# Altium schematic symbol library FPGA_Xilinx_Virtex5.SchLib: 41 symbols (part 15 of 17) (continued)
## XC5VTX150T-FF1156 (continued)
part O pins: A11 MGTRXP1_128, A12 MGTRXN1_128, A13 MGTRXN0_128, A14 MGTRXP0_128, A21 MGTRXP0_127, A22 MGTRXN0_127, A23 MGTRXN1_127, A24 MGTRXP1_127, B10 MGTTXP1_128, B11 MGTTXN1_128, B14 MGTTXN0_128, B15 MGTTXP0_128, B20 MGTTXP0_127, B21 MGTTXN0_127, B24 MGTTXN1_127, B25 MGTTXP1_127, D13 MGTREFCLKN_128, D14 MGTREFCLKP_128, D21 MGTREFCLKP_127, D22 MGTREFCLKN_127
part P pins: AL13 MGTREFCLKP_130, AL22 MGTREFCLKP_129, AM13 MGTREFCLKN_130, AM22 MGTREFCLKN_129, AN10 MGTTXP0_130, AN11 MGTTXN0_130, AN14 MGTTXN1_130, AN15 MGTTXP1_130, AN20 MGTTXP1_129, AN21 MGTTXN1_129, AN24 MGTTXN0_129, AN25 MGTTXP0_129, AP11 MGTRXP0_130, AP12 MGTRXN0_130, AP13 MGTRXN1_130, AP14 MGTRXP1_130, AP21 MGTRXP1_129, AP22 MGTRXN1_129, AP23 MGTRXN0_129, AP24 MGTRXP0_129
part Q pins: AA3 MGTAVCC_114, AA32 MGTAVCC_113, AB3 MGTAVCCPLL_114, AB32 MGTAVCCPLL_113, AC3 MGTAVTTTX_114, AC32 MGTAVTTTX_113, AE3 MGTAVTTRX_118, AE32 MGTAVTTRX_117, AG3 MGTAVCC_118, AG32 MGTAVCC_117, AH3 MGTAVCCPLL_118, AH32 MGTAVCCPLL_117, AJ3 MGTAVTTTX_118, AJ32 MGTAVTTTX_117, AL3 MGTAVTTRX_122, AL4 MGTAVCC_122, AL31 MGTAVCC_121, AL32 MGTAVTTRX_121, AM3 MGTAVTTTX_122, AM4 MGTAVCCPLL_122, AM6 MGTAVTTRX_126, AM8 MGTAVCC_126, AM9 MGTAVCCPLL_126, AM10 MGTAVTTTX_126, AM12 MGTAVTTRX_130, AM14 MGTAVCC_130, AM15 MGTAVCCPLL_130, AM20 MGTAVCCPLL_129, AM21 MGTAVCC_129, AM23 MGTAVTTRX_129, AM25 MGTAVTTTX_125, AM26 MGTAVCCPLL_125, AM27 MGTAVCC_125, AM29 MGTAVTTRX_125, AM31 MGTAVCCPLL_121, AM32 MGTAVTTTX_121, AP16 MGTAVTTTX_130, AP19 MGTAVTTTX_129, C3 MGTAVTTRX_120, C5 MGTAVTTTX_124, C6 MGTAVCCPLL_124, C8 MGTAVCC_124, C9 MGTAVTTRX_124, C11 MGTAVTTTX_128, C12 MGTAVCCPLL_128, C14 MGTAVCC_128, C15 MGTAVTTRX_128, C20 MGTAVTTRX_127, C21 MGTAVCC_127, C23 MGTAVCCPLL_127, C24 MGTAVTTTX_127, C26 MGTAVTTRX_123, C27 MGTAVCC_123, C29 MGTAVCCPLL_123, C30 MGTAVTTTX_123, C32 MGTAVTTRX_119, D3 MGTAVCCPLL_120, D4 MGTAVCC_120, D31 MGTAVCC_119, D32 MGTAVCCPLL_119, E3 MGTAVTTTX_120, E32 MGTAVTTTX_119, G3 MGTAVTTRX_116, G32 MGTAVTTRX_115, J3 MGTAVCC_116, J32 MGTAVCC_115, K3 MGTAVCCPLL_116, K32 MGTAVCCPLL_115, L3 MGTAVTTTX_116, L32 MGTAVTTTX_115, N3 MGTAVTTRX_112, N32 MGTAVTTRX_111, R3 MGTAVCC_112, R32 MGTAVCC_111, T3 MGTAVCCPLL_112, T32 MGTAVCCPLL_111, U3 MGTAVTTTX_112, U4 MGTAVTTRXC_R, U31 MGTAVTTRXC_L, U32 MGTAVTTTX_111, V4 MGTRREF_112, V31 MGTRREF_111, W3 MGTAVTTRX_114, W32 MGTAVTTRX_113
part R pins: AA25 CS_B_0, AB10 TCK_0, AB20 M0_0, AC9 TDI_0, AC10 TMS_0, AC20 M2_0, AC22 VCCO_0, AC23 RSVD_0, AC24 RSVD_0, AD9 TDO_0, AD10 D_OUT_BUSY_0, AD20 M1_0, K11 D_IN_0, L10 INIT_B_0, L11 DONE_0, M10 CCLK_0, M19 VCCO_0, T25 RDWR_B_0, T26 HSWAPEN_0, U17 VREFN_0, U18 VP_0, U26 PROGRAM_B_0, V17 VN_0, V18 VREFP_0, W17 DXN_0, W18 DXP_0
part S pins: A3 GND, A4 GND, A9 GND, A10 GND, A15 GND, A16 GND, A17 GND, A19 GND, A20 GND, A25 GND, A26 GND, A31 GND, A32 GND, AA12 VCCINT, AA14 VCCINT, AA16 VCCINT, AA18 VCCINT, AA20 VCCINT, AA22 VCCINT, AA24 VCCINT, AB11 VCCAUX, AB15 VCCINT, AB17 VCCINT, AB21 VCCINT, AB23 VCCINT, AC18 VCCINT, B1 GND, B6 GND, B7 GND, B12 GND, B13 GND, B16 GND, B19 GND, B22 GND, B23 GND, B28 GND, B29 GND, B34 GND, C2 GND, C4 GND, C7 GND, C10 GND, C13 GND, C16 GND, C19 GND, C22 GND, C25 GND, C28 GND, C31 GND, C33 GND, D5 GND, D6 GND, D9 GND, D10 GND, D11 GND, D12 GND, D15 GND, D16 GND, D18 GND, D19 GND, D20 GND, D23 GND, D24 GND, D25 GND, D26 GND, D29 GND, D30 GND, E1 GND, E5 GND, E6 GND, E7 GND, E8 GND, E9 GND, E10 GND, E12 GND, E13 GND, E14 GND, E15 GND, E20 GND, E21 GND, E22 GND, E23 GND, E25 GND, E26 GND, E27 GND, E28 GND, E29 GND, E30 GND, E34 GND, F1 GND, F3 GND, F5 GND, F7 GND, F12 GND, F22 GND, F27 GND, F29 GND, F30 GND, F32 GND, F34 GND, G4 GND, G5 GND, G9 GND, G19 GND, G29 GND, G30 GND, G31 GND, H2 GND, H5 GND, H6 GND, H16 GND, H26 GND, H30 GND, M23 VCCAUX, N12 VCCAUX, N14 VCCINT, N18 VCCINT, N20 VCCINT, N24 VCCAUX, P11 VCCAUX, P13 VCCINT, P15 VCCINT, P17 VCCINT, P19 VCCINT, P21 VCCINT, P23 VCCAUX, P24 VBATT_0, R12 VCCINT, R14 VCCINT, R16 VCCINT, R18 VCCINT, R20 VCCINT, R22 VCCINT, R24 VCCAUX, T11 VCCAUX, T13 VCCINT, T15 VCCINT, T17 AVSS_0, T18 AVDD_0, T19 VCCINT, T21 VCCINT, T23 VCCAUX, U12 VCCINT, U14 VCCINT, U16 VCCINT, U20 VCCINT, U22 VCCINT, U24 VCCAUX, V11 VCCAUX, V13 VCCINT, V15 VCCINT, V19 VCCINT, V21 VCCINT, V23 VCCINT, W12 VCCINT, W14 VCCINT, W16 VCCINT, W20 VCCINT, W22 VCCINT, Y11 VCCAUX, Y13 VCCINT, Y15 VCCINT, Y17 VCCINT, Y19 VCCINT, Y21 VCCINT, Y23 VCCINT
part T pins: AA2 GND, AA4 GND, AA5 GND, AA7 GND, AA11 GND, AA13 GND, AA15 GND, AA17 GND, AA19 GND, AA21 GND, AA23 GND, AA27 GND, AA30 GND, AA31 GND, AA33 GND, AB4 GND, AB9 GND, AB14 GND, AB22 GND, AB24 GND, AB31 GND, AC1 GND, AC4 GND, AC11 GND, AC13 GND, AC21 GND, AC31 GND, AC34 GND, AD1 GND, AD3 GND, AD4 GND, AD8 GND, AD18 GND, AD23 GND, AD28 GND, AD31 GND, AD32 GND, AD34 GND, AE4 GND, AE5 GND, AE15 GND, AE25 GND, AE30 GND, AE31 GND, AF2 GND, AF5 GND, AF12 GND, AF22 GND, AF30 GND, AF33 GND, AG2 GND, AG4 GND, AG5 GND, AG9 GND, AG19 GND, AG29 GND, AG30 GND, AG31 GND, AG33 GND, AH4 GND, AH5 GND, AH6 GND, AH16 GND, AH26 GND, AH30 GND, AH31 GND, AJ1 GND, AJ4 GND, AJ5 GND, AJ6 GND, AJ8 GND, AJ13 GND, AJ23 GND, AJ28 GND, AJ29 GND, AJ30 GND, AJ31 GND, AJ34 GND, AK1 GND, AK3 GND, AK4 GND, AK6 GND, AK7 GND, AK8 GND, AK10 GND, AK12 GND, AK13 GND, AK14 GND, AK15 GND, AK20 GND, AK21 GND, AK22 GND, AK23 GND, AK25 GND, AK27 GND, AK28 GND, AK29 GND, AK31 GND, AK32 GND, AK34 GND, AL6 GND, AL8 GND, AL9 GND, AL10 GND, AL11 GND, AL12 GND, AL14 GND, AL15 GND, AL16 GND, AL17 GND, AL19 GND, AL20 GND, AL21 GND, AL23 GND, AL24 GND, AL25 GND, AL26 GND, AL27 GND, AL29 GND, AM2 GND, AM5 GND, AM11 GND, AM16 GND, AM17 GND, AM18 GND, AM19 GND, AM24 GND, AM30 GND, AM33 GND, AN1 GND, AN6 GND, AN7 GND, AN12 GND, AN13 GND, AN16 GND, AN17 GND, AN18 GND, AN19 GND, AN22 GND, AN23 GND, AN28 GND, AN29 GND, AN34 GND, AP3 GND, AP4 GND, AP9 GND, AP10 GND, AP15 GND, AP17 GND, AP18 GND, AP20 GND, AP25 GND, AP26 GND, AP31 GND, AP32 GND, H33 GND, J2 GND, J4 GND, J5 GND, J13 GND, J23 GND, J30 GND, J31 GND, J33 GND, K4 GND, K5 GND, K10 GND, K20 GND, K30 GND, K31 GND, L1 GND, L4 GND, L7 GND, L17 GND, L27 GND, L31 GND, L34 GND, M1 GND, M3 GND, M4 GND, M9 GND, M14 GND, M24 GND, M31 GND, M32 GND, M34 GND, N4 GND, N5 GND, N6 GND, N11 GND, N19 GND, N21 GND, N23 GND, N30 GND, N31 GND, P2 GND, P5 GND, P8 GND, P12 GND, P14 GND, P16 GND, P18 GND, P20 GND, P22 GND, P28 GND, P30 GND, P33 GND, R2 GND, R4 GND, R5 GND, R11 GND, R13 GND, R15 GND, R17 GND, R19 GND, R21 GND, R23 GND, R25 GND, R30 GND, R31 GND, R33 GND, T4 GND, T5 GND, T12 GND, T14 GND, T16 GND, T20 GND, T22 GND, T24 GND, T30 GND, T31 GND, U1 GND, U5 GND, U9 GND, U11 GND, U13 GND, U15 GND, U19 GND, U21 GND, U23 GND, U29 GND, U30 GND, U34 GND, V1 GND, V3 GND, V5 GND, V6 GND, V12 GND, V14 GND, V16 GND, V20 GND, V22 GND, V26 GND, V30 GND, V32 GND, V34 GND, W4 GND, W5 GND, W11 GND, W13 GND, W15 GND, W19 GND, W21 GND, W23 GND, W28 GND, W30 GND, W31 GND, Y2 GND, Y5 GND, Y10 GND, Y12 GND, Y14 GND, Y16 GND, Y18 GND, Y20 GND, Y22 GND, Y30 GND, Y33 GND

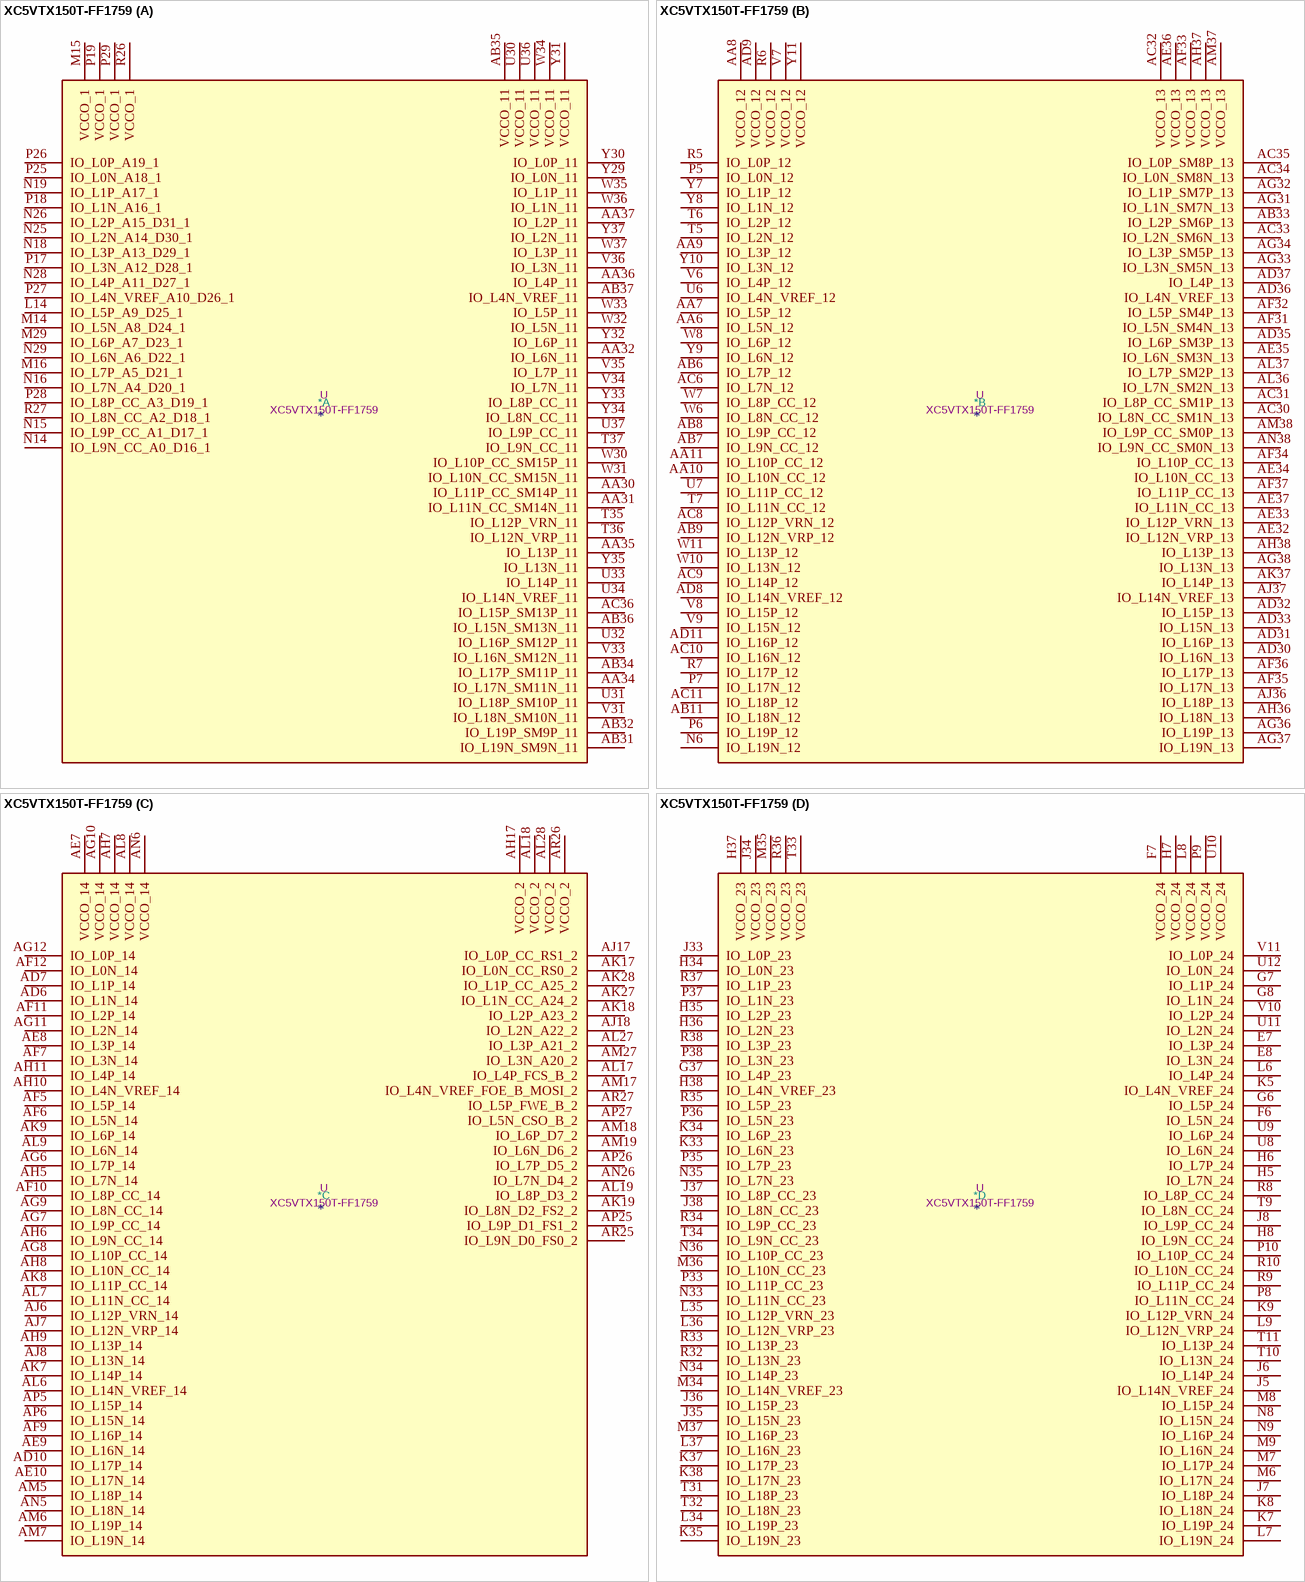
[diagram p129: symbol XC5VTX150T-FF1759]

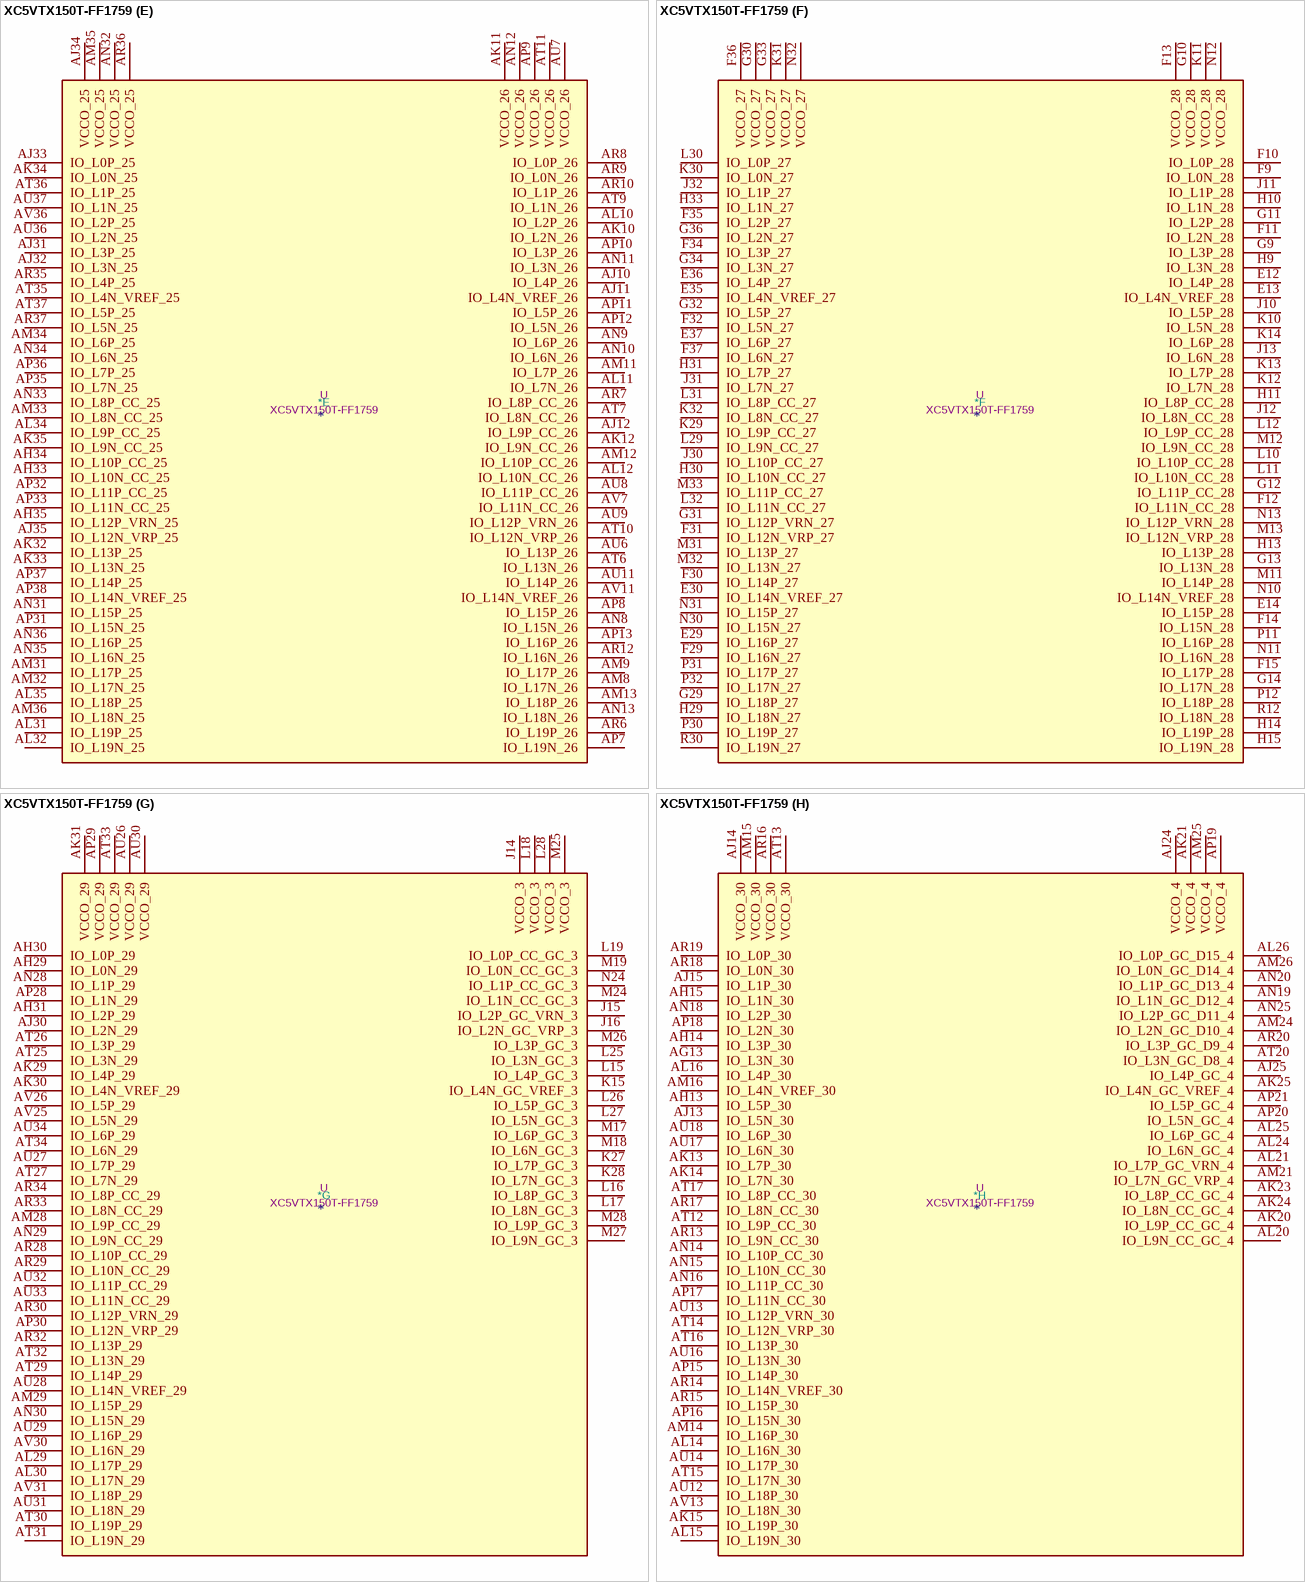
[diagram p130: symbol XC5VTX150T-FF1759]

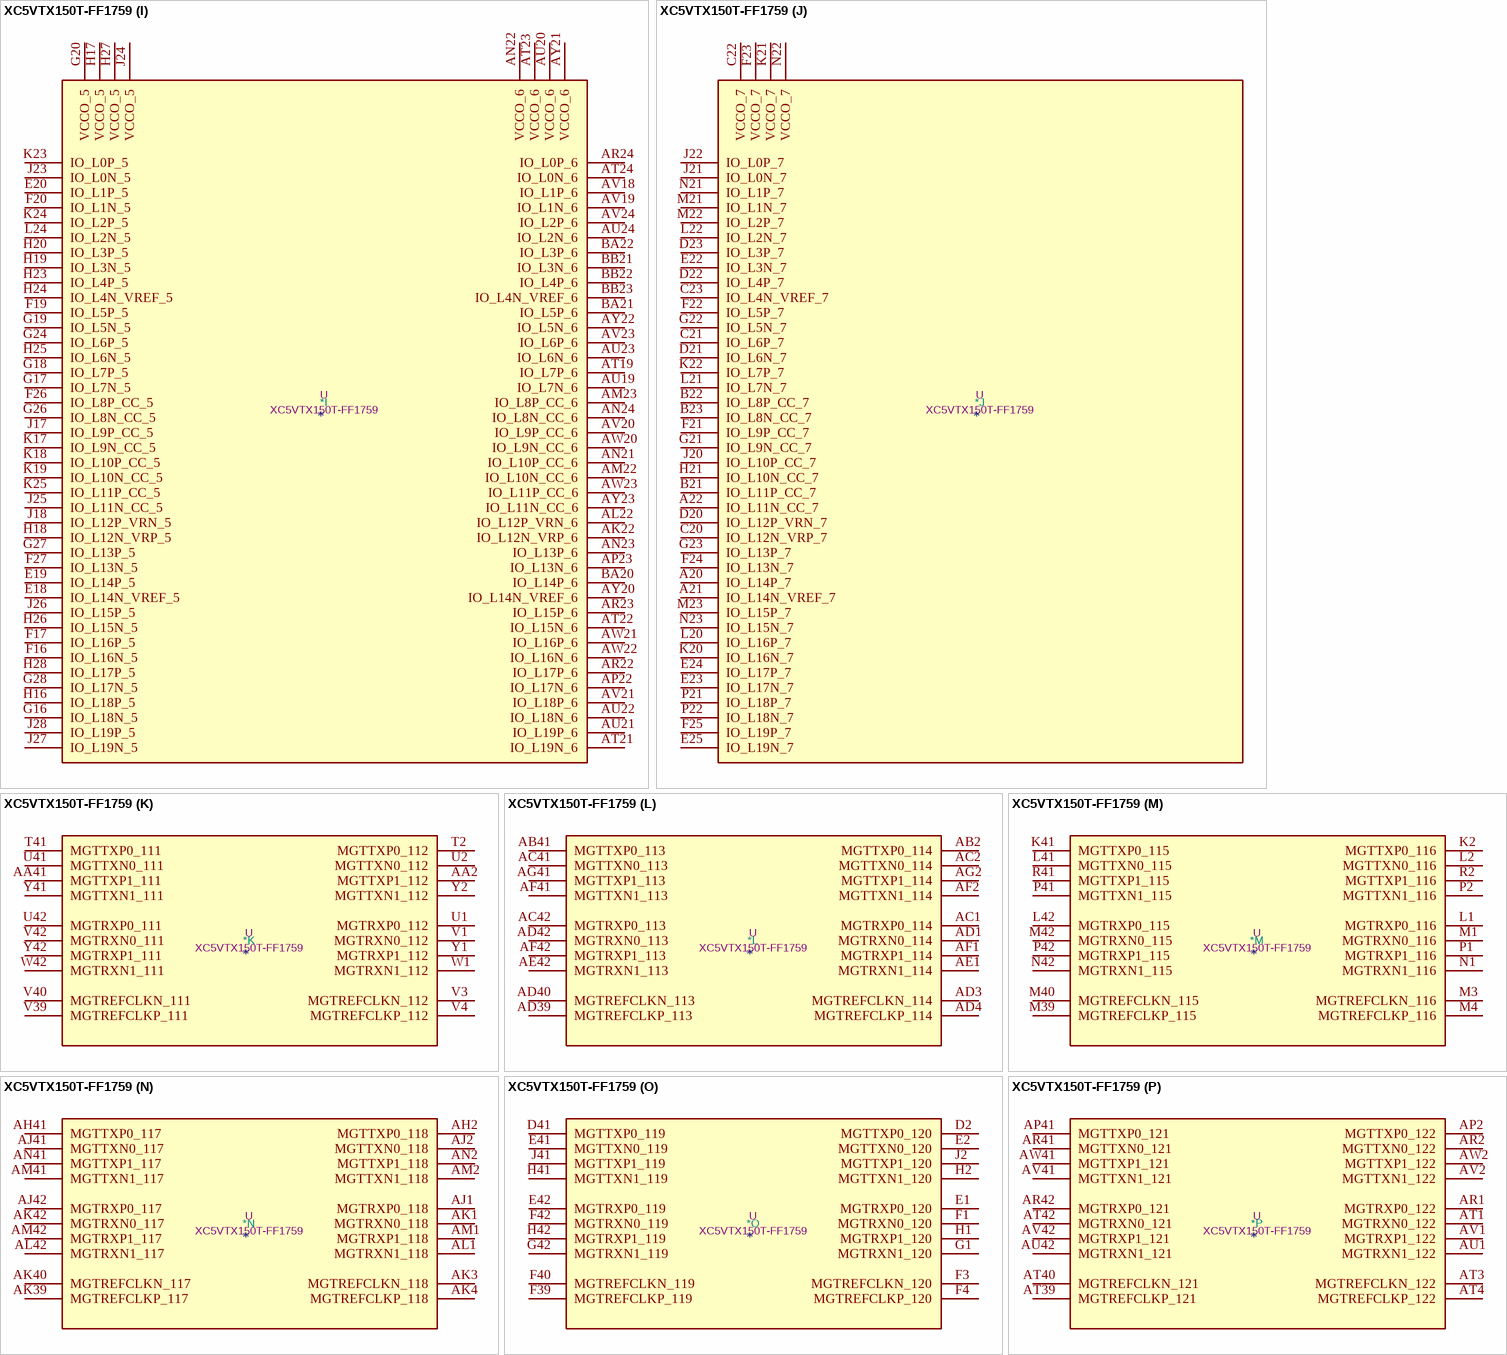
[diagram p131: symbol XC5VTX150T-FF1759]

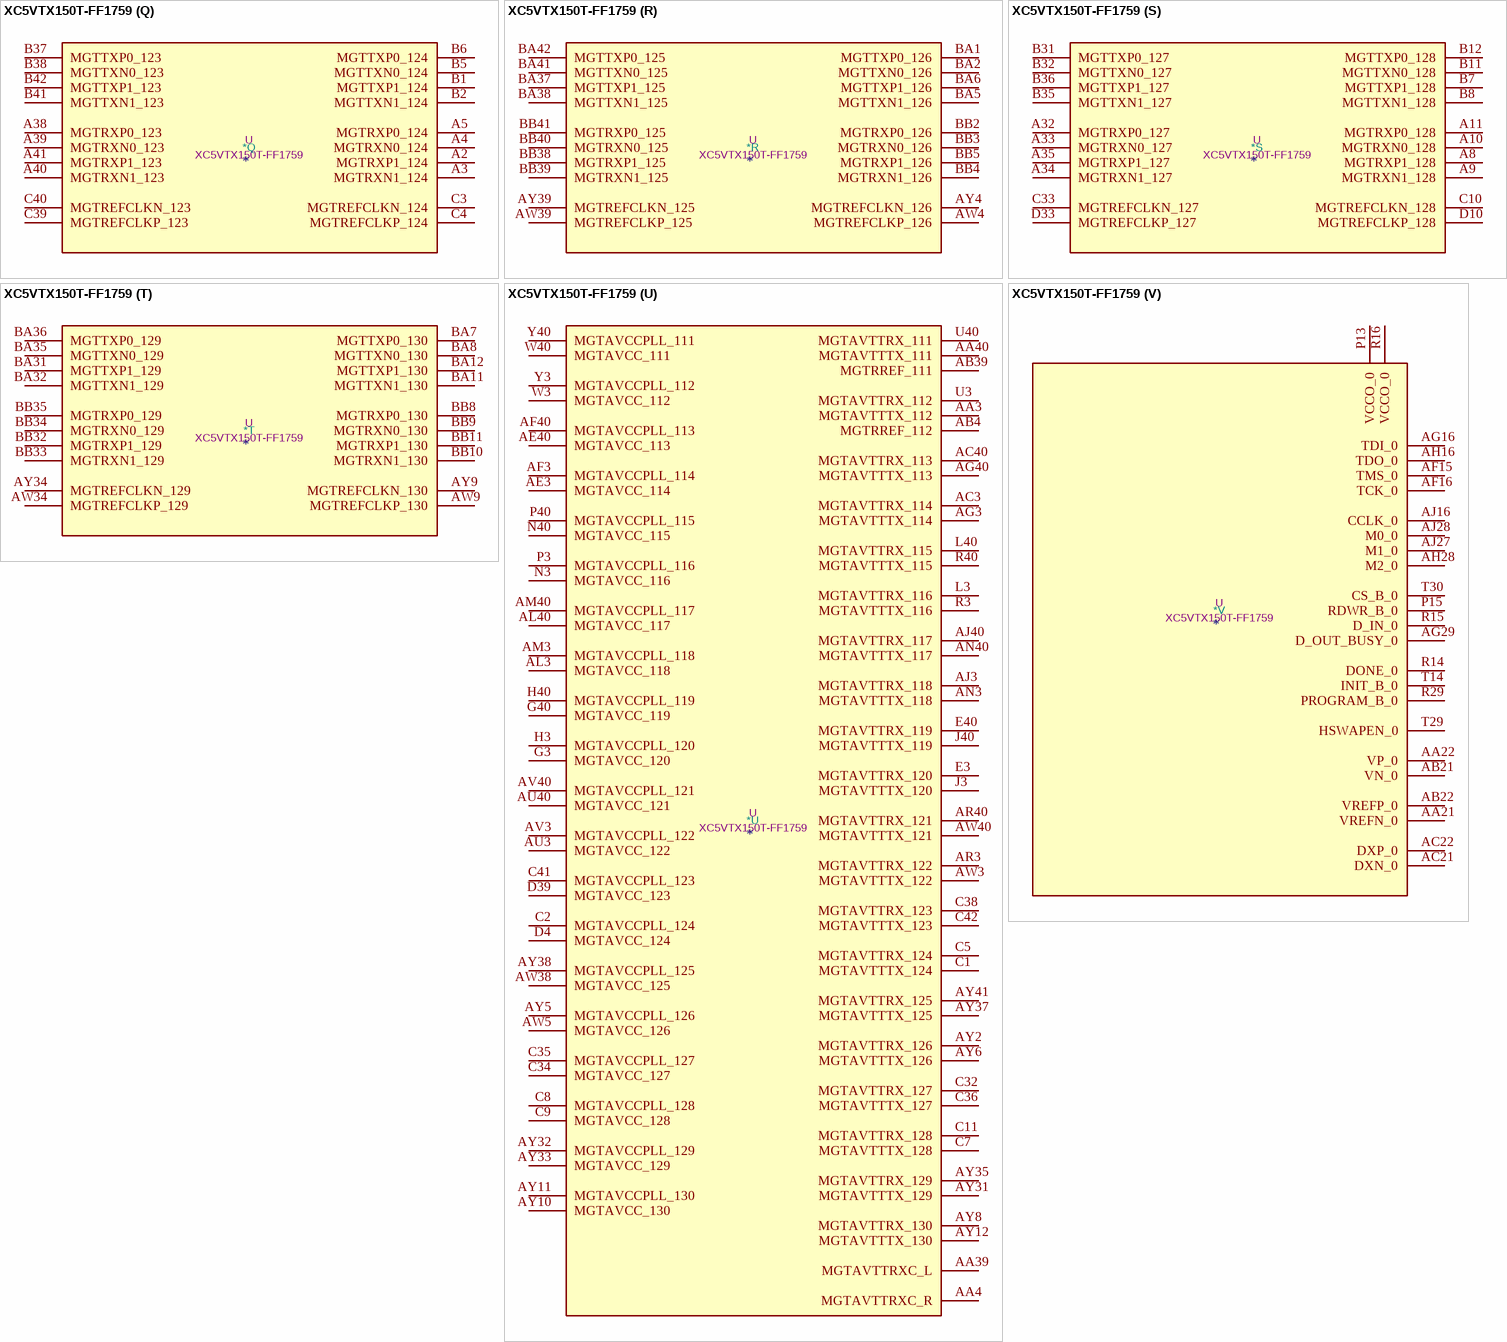
[diagram p132: symbol XC5VTX150T-FF1759]

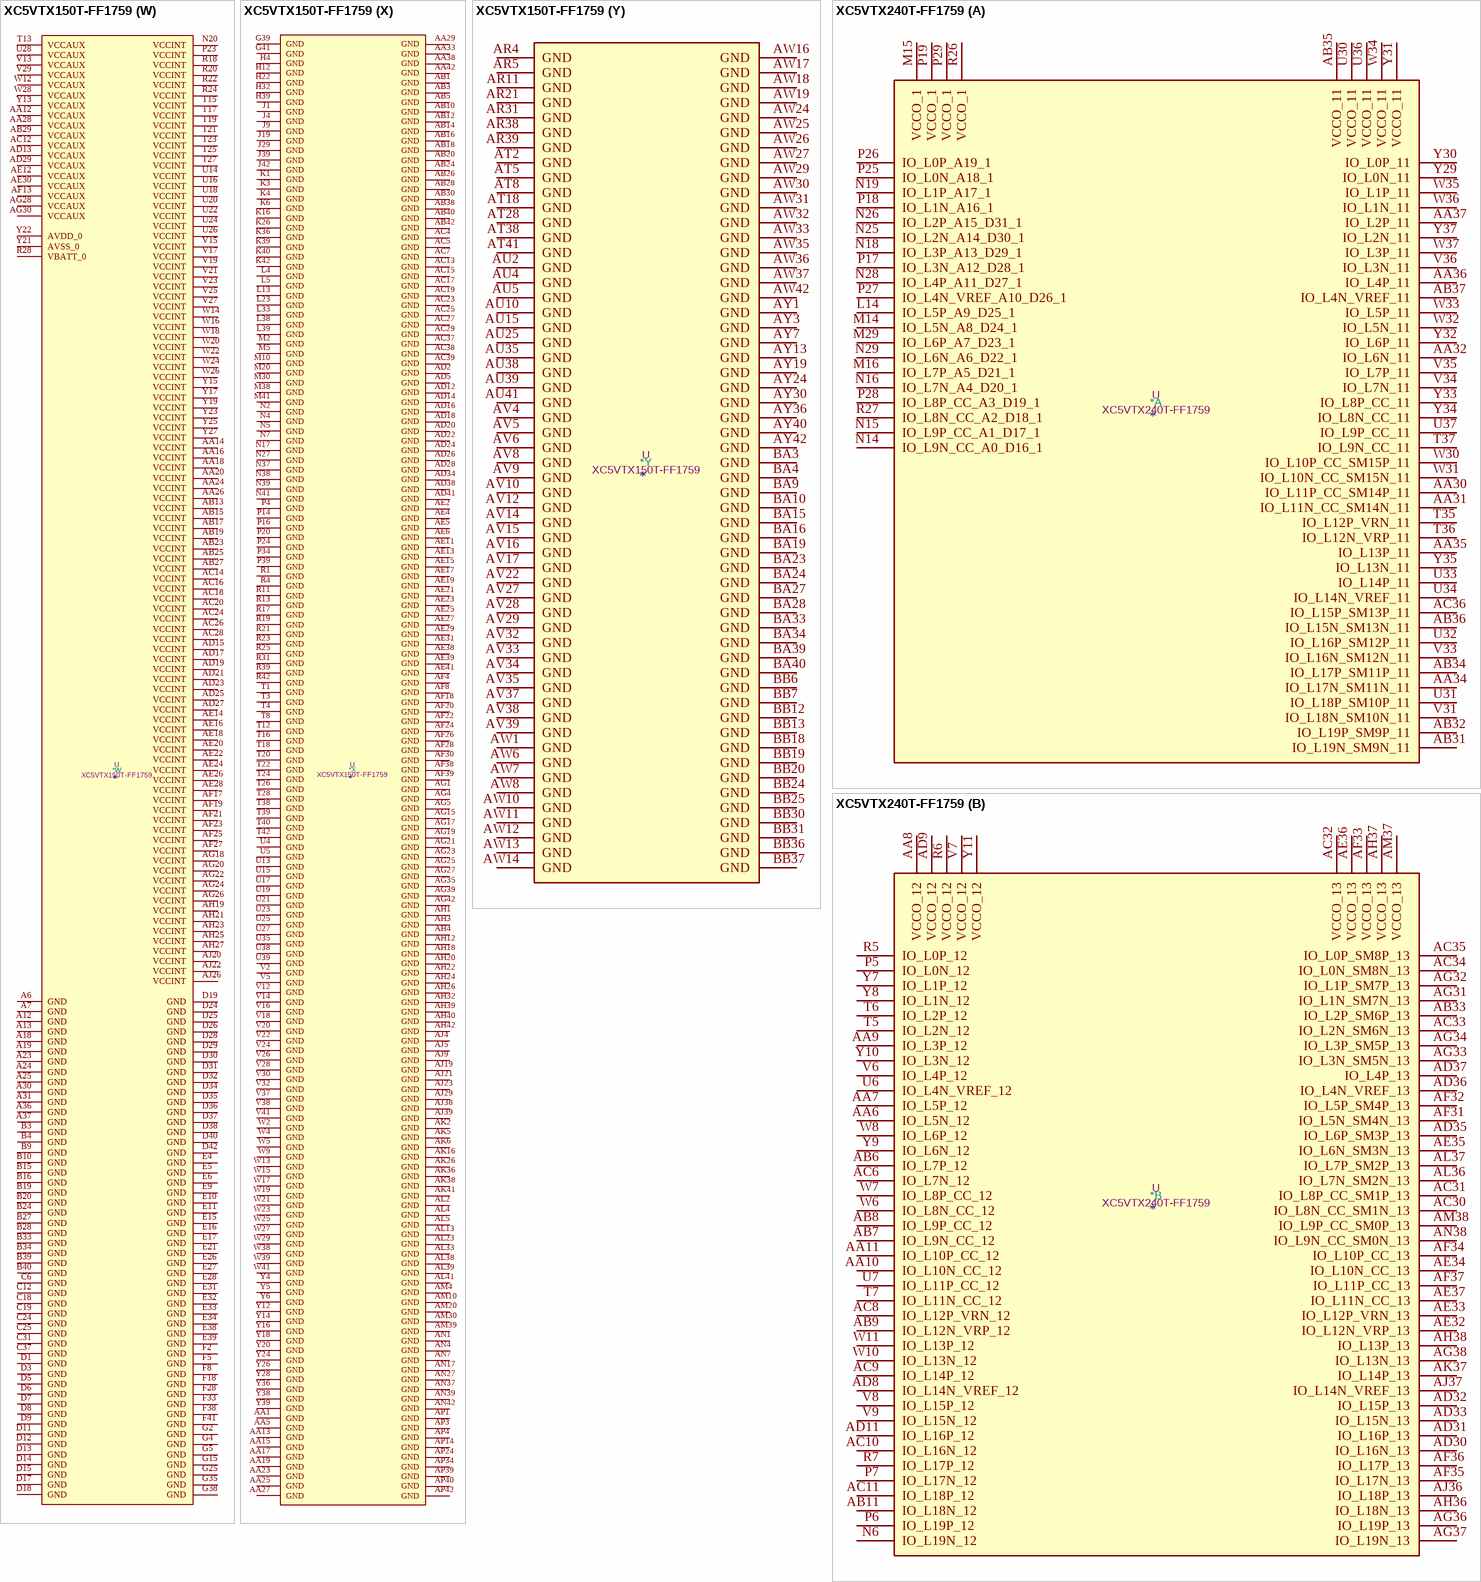
[diagram p133: symbols XC5VTX150T-FF1759 to XC5VTX240T-FF1759]